# Altium integrated library My_LIB.IntLib: 372 symbols (part 2 of 3) (continued)
## STM32F100CxT6 (continued)
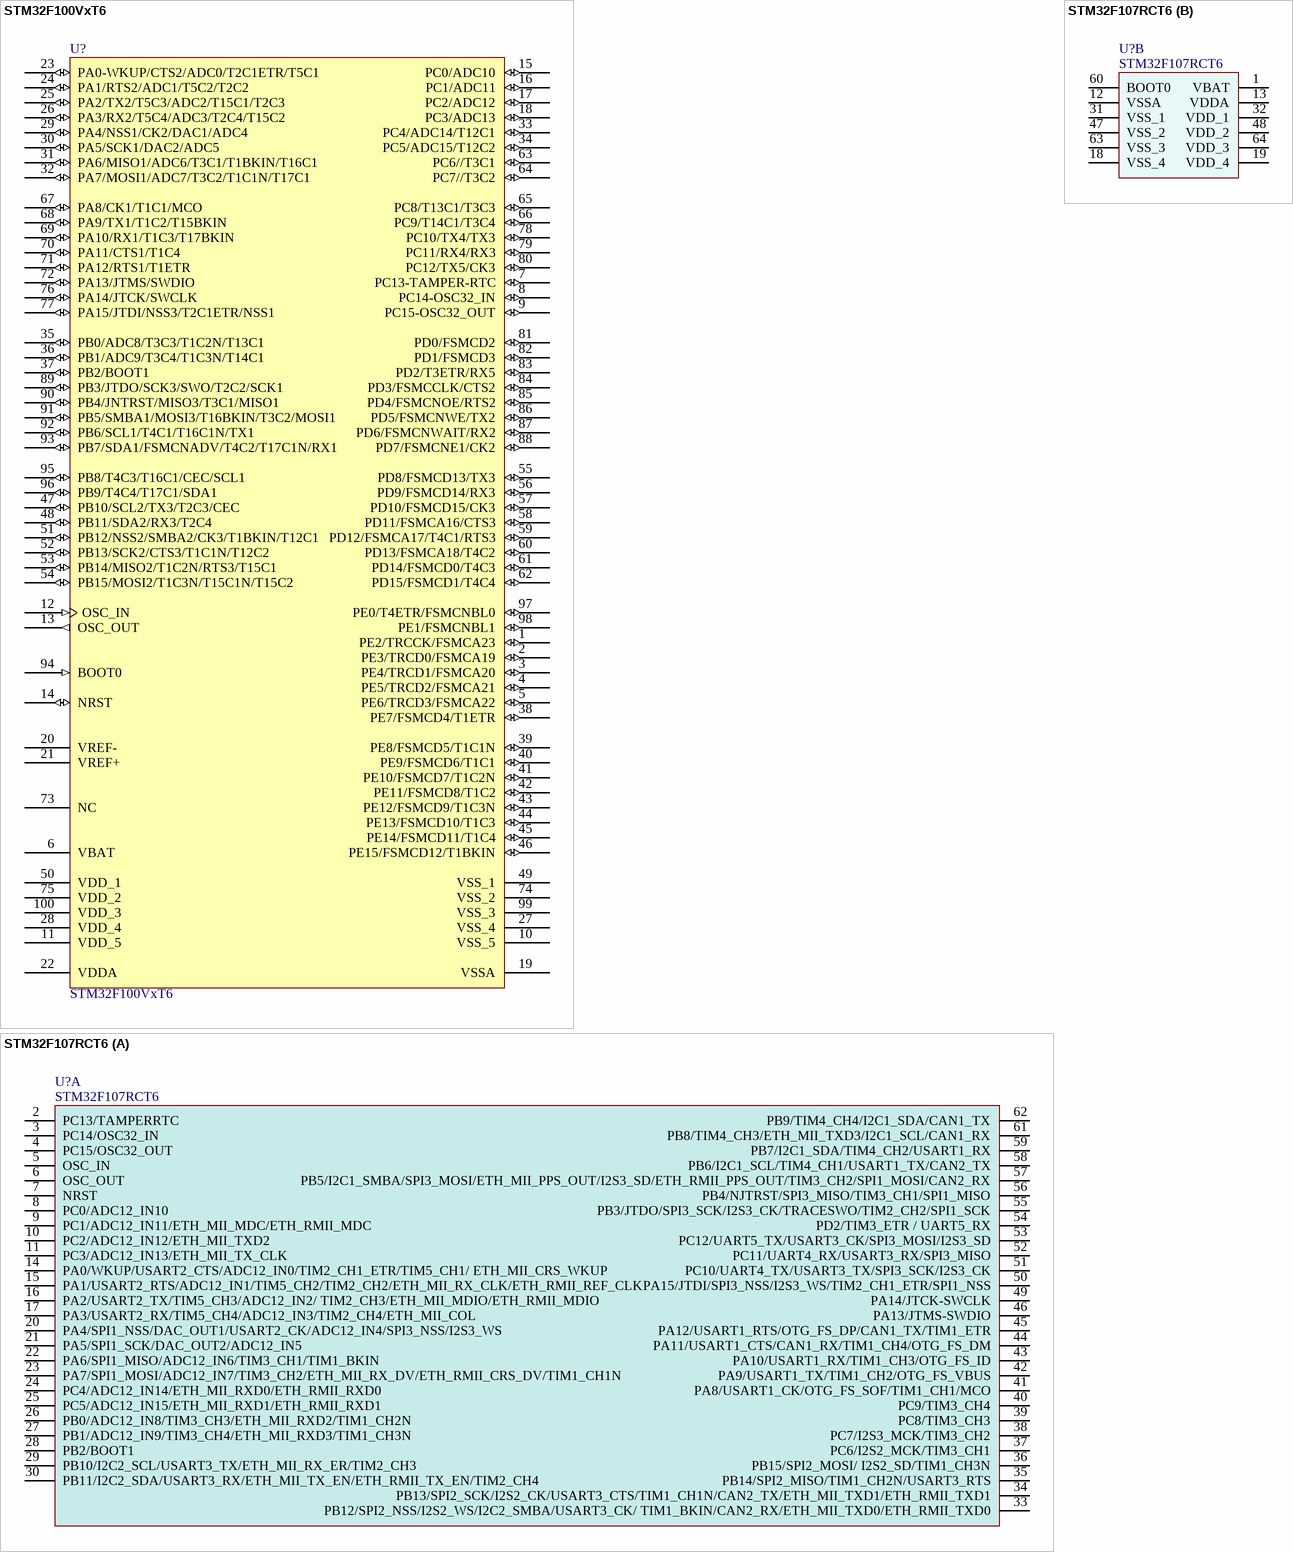
[diagram p11: symbols STM32F100VxT6 to STM32F107RCT6]

## STM32F100VxT6
designator U?
STM32 ARM-based 32-bit MCU with 64 Kbytes Flash, 100-pin LQFP, Industrial Temperature; Published: 30-May-2008; DatasheetVersion: rev6, Mar-2008; PackageVersion: Mar-2008; PackageReference: LQFP100; Publisher: Altium Limited; PackageDescription: 100-Pin Low-Profile Quad Flat Pack, 14 x 14 mm Body, 0.5 mm Pitch (LQFP100); ComponentLink1Description: Manufacturer Link; ComponentLink1URL: www.st.com/stm32; ComponentLink2Description: Datasheet; ComponentLink2URL: http://www.st.com/stonline/products/literature/ds/13587.pdf
footprint LQFP100_N (Thin QFP, 100-Leads, Body 14x14mm, Pitch 0.5mm, IPC Medium Density)
footprint LQFP100_L (Thin QFP, 100-Leads, Body 14x14mm, Pitch 0.5mm, IPC High Density)
footprint LQFP100_M (Thin QFP, 100-Leads, Body 14x14mm, Pitch 0.5mm, IPC Low Density)
pins: 1 PE2/TRCCK/FSMCA23 (io), 2 PE3/TRCD0/FSMCA19 (io), 3 PE4/TRCD1/FSMCA20 (io), 4 PE5/TRCD2/FSMCA21 (io), 5 PE6/TRCD3/FSMCA22 (io), 6 VBAT (power), 7 PC13-TAMPER-RTC (io), 8 PC14-OSC32_IN (io), 9 PC15-OSC32_OUT (io), 10 VSS_5 (power), 11 VDD_5 (power), 12 OSC_IN (in), 13 OSC_OUT (out), 14 NRST (io), 15 PC0/ADC10 (io), 16 PC1/ADC11 (io), 17 PC2/ADC12 (io), 18 PC3/ADC13 (io), 19 VSSA (power), 20 VREF- (power), 21 VREF+ (power), 22 VDDA (power), 23 PA0-WKUP/CTS2/ADC0/T2C1ETR/T5C1 (io), 24 PA1/RTS2/ADC1/T5C2/T2C2 (io), 25 PA2/TX2/T5C3/ADC2/T15C1/T2C3 (io), 26 PA3/RX2/T5C4/ADC3/T2C4/T15C2 (io), 27 VSS_4 (power), 28 VDD_4 (power), 29 PA4/NSS1/CK2/DAC1/ADC4 (io), 30 PA5/SCK1/DAC2/ADC5 (io), 31 PA6/MISO1/ADC6/T3C1/T1BKIN/T16C1 (io), 32 PA7/MOSI1/ADC7/T3C2/T1C1N/T17C1 (io), 33 PC4/ADC14/T12C1 (io), 34 PC5/ADC15/T12C2 (io), 35 PB0/ADC8/T3C3/T1C2N/T13C1 (io), 36 PB1/ADC9/T3C4/T1C3N/T14C1 (io), 37 PB2/BOOT1 (io), 38 PE7/FSMCD4/T1ETR (io), 39 PE8/FSMCD5/T1C1N (io), 40 PE9/FSMCD6/T1C1 (io), 41 PE10/FSMCD7/T1C2N (io), 42 PE11/FSMCD8/T1C2 (io), 43 PE12/FSMCD9/T1C3N (io), 44 PE13/FSMCD10/T1C3 (io), 45 PE14/FSMCD11/T1C4 (io), 46 PE15/FSMCD12/T1BKIN (io), 47 PB10/SCL2/TX3/T2C3/CEC (io), 48 PB11/SDA2/RX3/T2C4 (io), 49 VSS_1 (power), 50 VDD_1 (power), 51 PB12/NSS2/SMBA2/CK3/T1BKIN/T12C1 (io), 52 PB13/SCK2/CTS3/T1C1N/T12C2 (io), 53 PB14/MISO2/T1C2N/RTS3/T15C1 (io), 54 PB15/MOSI2/T1C3N/T15C1N/T15C2 (io), 55 PD8/FSMCD13/TX3 (io), 56 PD9/FSMCD14/RX3 (io), 57 PD10/FSMCD15/CK3 (io), 58 PD11/FSMCA16/CTS3 (io), 59 PD12/FSMCA17/T4C1/RTS3 (io), 60 PD13/FSMCA18/T4C2 (io), 61 PD14/FSMCD0/T4C3 (io), 62 PD15/FSMCD1/T4C4 (io), 63 PC6//T3C1 (io), 64 PC7//T3C2 (io), 65 PC8/T13C1/T3C3 (io), 66 PC9/T14C1/T3C4 (io), 67 PA8/CK1/T1C1/MCO (io), 68 PA9/TX1/T1C2/T15BKIN (io), 69 PA10/RX1/T1C3/T17BKIN (io), 70 PA11/CTS1/T1C4 (io), 71 PA12/RTS1/T1ETR (io), 72 PA13/JTMS/SWDIO (io), 73 NC, 74 VSS_2 (power), 75 VDD_2 (power), 76 PA14/JTCK/SWCLK (io), 77 PA15/JTDI/NSS3/T2C1ETR/NSS1 (io), 78 PC10/TX4/TX3 (io), 79 PC11/RX4/RX3 (io), 80 PC12/TX5/CK3 (io), 81 PD0/FSMCD2 (io), 82 PD1/FSMCD3 (io), 83 PD2/T3ETR/RX5 (io), 84 PD3/FSMCCLK/CTS2 (io), 85 PD4/FSMCNOE/RTS2 (io), 86 PD5/FSMCNWE/TX2 (io), 87 PD6/FSMCNWAIT/RX2 (io), 88 PD7/FSMCNE1/CK2 (io), 89 PB3/JTDO/SCK3/SWO/T2C2/SCK1 (io), 90 PB4/JNTRST/MISO3/T3C1/MISO1 (io), 91 PB5/SMBA1/MOSI3/T16BKIN/T3C2/MOSI1 (io), 92 PB6/SCL1/T4C1/T16C1N/TX1 (io), 93 PB7/SDA1/FSMCNADV/T4C2/T17C1N/RX1 (io), 94 BOOT0 (in), 95 PB8/T4C3/T16C1/CEC/SCL1 (io), 96 PB9/T4C4/T17C1/SDA1 (io), 97 PE0/T4ETR/FSMCNBL0 (io), 98 PE1/FSMCNBL1 (io), 99 VSS_3 (power), 100 VDD_3 (power)

## STM32F107RCT6
designator U?
footprint LQFP64 (Thin QFP, 64-Leads, Body 10x10mm, Pitch 0.5mm, IPC Low Density)
footprint LQFP64-DIL-Slave (Thin QFP, 64-Leads, Body 10x10mm, Pitch 0.5mm, IPC Low Density)
footprint LQFP64-DIL-Main (Thin QFP, 64-Leads, Body 10x10mm, Pitch 0.5mm, IPC Low Density)
part A pins: 2 PC13/TAMPERRTC, 3 PC14/OSC32_IN, 4 PC15/OSC32_OUT, 5 OSC_IN, 6 OSC_OUT, 7 NRST, 8 PC0/ADC12_IN10, 9 PC1/ADC12_IN11/ETH_MII_MDC/ETH_RMII_MDC, 10 PC2/ADC12_IN12/ETH_MII_TXD2, 11 PC3/ADC12_IN13/ETH_MII_TX_CLK, 14 PA0/WKUP/USART2_CTS/ADC12_IN0/TIM2_CH1_ETR/TIM5_CH1/ ETH_MII_CRS_WKUP, 15 PA1/USART2_RTS/ADC12_IN1/TIM5_CH2/TIM2_CH2/ETH_MII_RX_CLK/ETH_RMII_REF_CLK, 16 PA2/USART2_TX/TIM5_CH3/ADC12_IN2/ TIM2_CH3/ETH_MII_MDIO/ETH_RMII_MDIO, 17 PA3/USART2_RX/TIM5_CH4/ADC12_IN3/TIM2_CH4/ETH_MII_COL, 20 PA4/SPI1_NSS/DAC_OUT1/USART2_CK/ADC12_IN4/SPI3_NSS/I2S3_WS, 21 PA5/SPI1_SCK/DAC_OUT2/ADC12_IN5, 22 PA6/SPI1_MISO/ADC12_IN6/TIM3_CH1/TIM1_BKIN, 23 PA7/SPI1_MOSI/ADC12_IN7/TIM3_CH2/ETH_MII_RX_DV/ETH_RMII_CRS_DV/TIM1_CH1N, 24 PC4/ADC12_IN14/ETH_MII_RXD0/ETH_RMII_RXD0, 25 PC5/ADC12_IN15/ETH_MII_RXD1/ETH_RMII_RXD1, 26 PB0/ADC12_IN8/TIM3_CH3/ETH_MII_RXD2/TIM1_CH2N, 27 PB1/ADC12_IN9/TIM3_CH4/ETH_MII_RXD3/TIM1_CH3N, 28 PB2/BOOT1, 29 PB10/I2C2_SCL/USART3_TX/ETH_MII_RX_ER/TIM2_CH3, 30 PB11/I2C2_SDA/USART3_RX/ETH_MII_TX_EN/ETH_RMII_TX_EN/TIM2_CH4, 33 PB12/SPI2_NSS/I2S2_WS/I2C2_SMBA/USART3_CK/ TIM1_BKIN/CAN2_RX/ETH_MII_TXD0/ETH_RMII_TXD0, 34 PB13/SPI2_SCK/I2S2_CK/USART3_CTS/TIM1_CH1N/CAN2_TX/ETH_MII_TXD1/ETH_RMII_TXD1, 35 PB14/SPI2_MISO/TIM1_CH2N/USART3_RTS, 36 PB15/SPI2_MOSI/ I2S2_SD/TIM1_CH3N, 37 PC6/I2S2_MCK/TIM3_CH1, 38 PC7/I2S3_MCK/TIM3_CH2, 39 PC8/TIM3_CH3, 40 PC9/TIM3_CH4, 41 PA8/USART1_CK/OTG_FS_SOF/TIM1_CH1/MCO, 42 PA9/USART1_TX/TIM1_CH2/OTG_FS_VBUS, 43 PA10/USART1_RX/TIM1_CH3/OTG_FS_ID, 44 PA11/USART1_CTS/CAN1_RX/TIM1_CH4/OTG_FS_DM, 45 PA12/USART1_RTS/OTG_FS_DP/CAN1_TX/TIM1_ETR, 46 PA13/JTMS-SWDIO, 49 PA14/JTCK-SWCLK, 50 PA15/JTDI/SPI3_NSS/I2S3_WS/TIM2_CH1_ETR/SPI1_NSS, 51 PC10/UART4_TX/USART3_TX/SPI3_SCK/I2S3_CK, 52 PC11/UART4_RX/USART3_RX/SPI3_MISO, 53 PC12/UART5_TX/USART3_CK/SPI3_MOSI/I2S3_SD, 54 PD2/TIM3_ETR / UART5_RX, 55 PB3/JTDO/SPI3_SCK/I2S3_CK/TRACESWO/TIM2_CH2/SPI1_SCK, 56 PB4/NJTRST/SPI3_MISO/TIM3_CH1/SPI1_MISO, 57 PB5/I2C1_SMBA/SPI3_MOSI/ETH_MII_PPS_OUT/I2S3_SD/ETH_RMII_PPS_OUT/TIM3_CH2/SPI1_MOSI/CAN2_RX, 58 PB6/I2C1_SCL/TIM4_CH1/USART1_TX/CAN2_TX, 59 PB7/I2C1_SDA/TIM4_CH2/USART1_RX, 61 PB8/TIM4_CH3/ETH_MII_TXD3/I2C1_SCL/CAN1_RX, 62 PB9/TIM4_CH4/I2C1_SDA/CAN1_TX
part B pins: 1 VBAT, 12 VSSA, 13 VDDA, 18 VSS_4, 19 VDD_4, 31 VSS_1, 32 VDD_1, 47 VSS_2, 48 VDD_2, 60 BOOT0, 63 VSS_3, 64 VDD_3

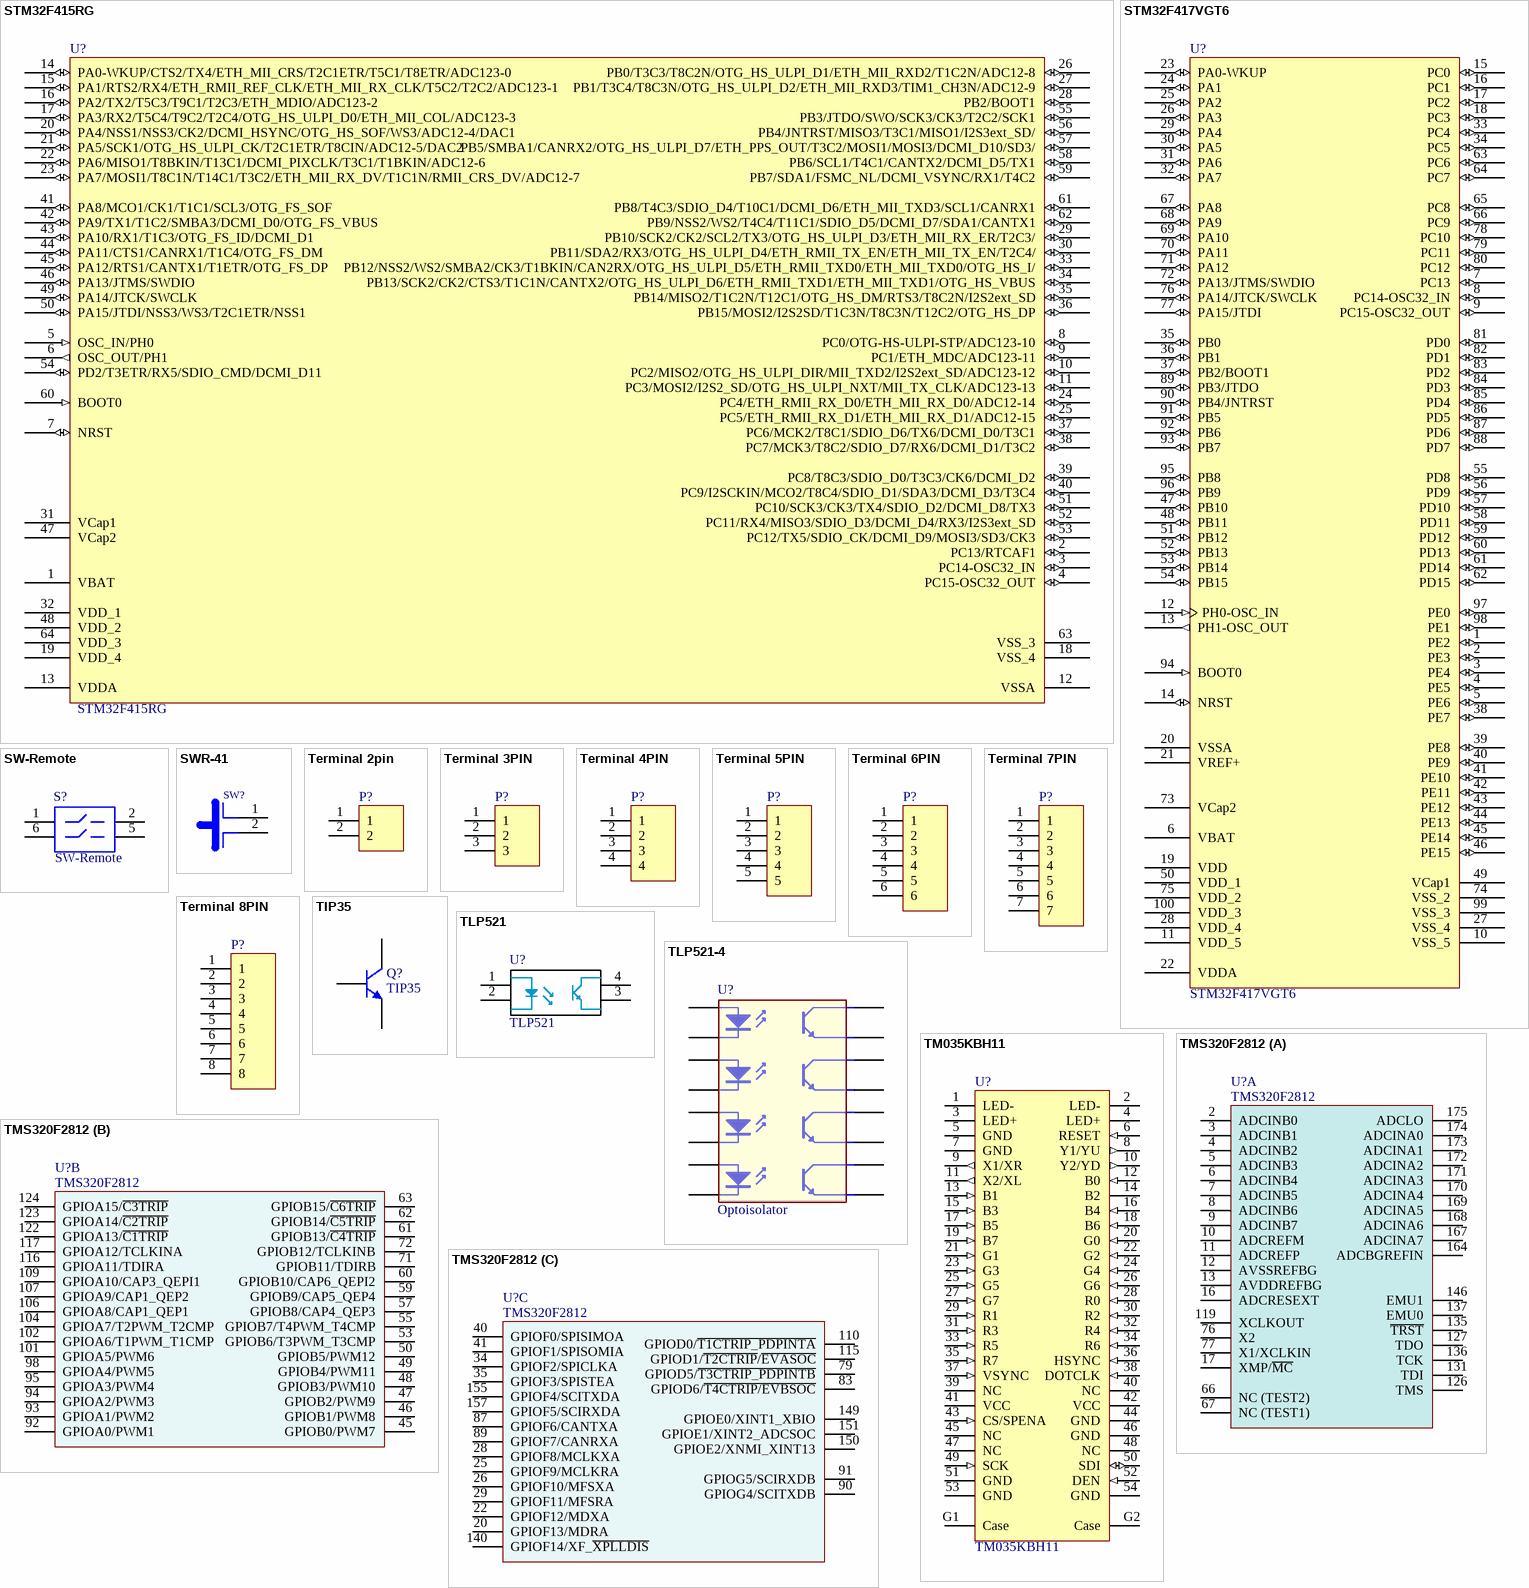
[diagram p12: symbols STM32F415RG to TMS320F2812]

## STM32F415RG
designator U?
Our STM32 Display IC; Published: 30-May-2008; DatasheetVersion: rev6, Mar-2008; PackageVersion: Mar-2008; PackageReference: LQFP64; Publisher: Altium Limited; PackageDescription: 64-Pin Low-Profile Quad Flat Pack, 10 x 10 mm Body, 0.5 mm Pitch (LQFP64); ComponentLink1Description: Manufacturer Link; ComponentLink1URL: www.st.com/stm32; ComponentLink2Description: Datasheet; ComponentLink2URL: http://www.st.com/stonline/products/literature/ds/13586.pdf
footprint LQFP64 (Thin QFP, 64-Leads, Body 10x10mm, Pitch 0.5mm, IPC Low Density)
pins: 1 VBAT (power), 2 PC13/RTCAF1 (io), 3 PC14-OSC32_IN (io), 4 PC15-OSC32_OUT (io), 5 OSC_IN/PH0 (in), 6 OSC_OUT/PH1 (out), 7 NRST (io), 8 PC0/OTG-HS-ULPI-STP/ADC123-10 (io), 9 PC1/ETH_MDC/ADC123-11 (io), 10 PC2/MISO2/OTG_HS_ULPI_DIR/MII_TXD2/I2S2ext_SD/ADC123-12 (io), 11 PC3/MOSI2/I2S2_SD/OTG_HS_ULPI_NXT/MII_TX_CLK/ADC123-13 (io), 12 VSSA (power), 13 VDDA (power), 14 PA0-WKUP/CTS2/TX4/ETH_MII_CRS/T2C1ETR/T5C1/T8ETR/ADC123-0 (io), 15 PA1/RTS2/RX4/ETH_RMII_REF_CLK/ETH_MII_RX_CLK/T5C2/T2C2/ADC123-1 (io), 16 PA2/TX2/T5C3/T9C1/T2C3/ETH_MDIO/ADC123-2 (io), 17 PA3/RX2/T5C4/T9C2/T2C4/OTG_HS_ULPI_D0/ETH_MII_COL/ADC123-3 (io), 18 VSS_4 (power), 19 VDD_4 (power), 20 PA4/NSS1/NSS3/CK2/DCMI_HSYNC/OTG_HS_SOF/WS3/ADC12-4/DAC1 (io), 21 PA5/SCK1/OTG_HS_ULPI_CK/T2C1ETR/T8CIN/ADC12-5/DAC2 (io), 22 PA6/MISO1/T8BKIN/T13C1/DCMI_PIXCLK/T3C1/T1BKIN/ADC12-6 (io), 23 PA7/MOSI1/T8C1N/T14C1/T3C2/ETH_MII_RX_DV/T1C1N/RMII_CRS_DV/ADC12-7 (io), 24 PC4/ETH_RMII_RX_D0/ETH_MII_RX_D0/ADC12-14 (io), 25 PC5/ETH_RMII_RX_D1/ETH_MII_RX_D1/ADC12-15 (io), 26 PB0/T3C3/T8C2N/OTG_HS_ULPI_D1/ETH_MII_RXD2/T1C2N/ADC12-8 (io), 27 PB1/T3C4/T8C3N/OTG_HS_ULPI_D2/ETH_MII_RXD3/TIM1_CH3N/ADC12-9 (io), 28 PB2/BOOT1 (io), 29 PB10/SCK2/CK2/SCL2/TX3/OTG_HS_ULPI_D3/ETH_MII_RX_ER/T2C3/ (io), 30 PB11/SDA2/RX3/OTG_HS_ULPI_D4/ETH_RMII_TX_EN/ETH_MII_TX_EN/T2C4/ (io), 31 VCap1 (power), 32 VDD_1 (power), 33 PB12/NSS2/WS2/SMBA2/CK3/T1BKIN/CAN2RX/OTG_HS_ULPI_D5/ETH_RMII_TXD0/ETH_MII_TXD0/OTG_HS_I/ (io), 34 PB13/SCK2/CK2/CTS3/T1C1N/CANTX2/OTG_HS_ULPI_D6/ETH_RMII_TXD1/ETH_MII_TXD1/OTG_HS_VBUS (io), 35 PB14/MISO2/T1C2N/T12C1/OTG_HS_DM/RTS3/T8C2N/I2S2ext_SD (io), 36 PB15/MOSI2/I2S2SD/T1C3N/T8C3N/T12C2/OTG_HS_DP (io), 37 PC6/MCK2/T8C1/SDIO_D6/TX6/DCMI_D0/T3C1 (io), 38 PC7/MCK3/T8C2/SDIO_D7/RX6/DCMI_D1/T3C2 (io), 39 PC8/T8C3/SDIO_D0/T3C3/CK6/DCMI_D2 (io), 40 PC9/I2SCKIN/MCO2/T8C4/SDIO_D1/SDA3/DCMI_D3/T3C4 (io), 41 PA8/MCO1/CK1/T1C1/SCL3/OTG_FS_SOF (io), 42 PA9/TX1/T1C2/SMBA3/DCMI_D0/OTG_FS_VBUS (io), 43 PA10/RX1/T1C3/OTG_FS_ID/DCMI_D1 (io), 44 PA11/CTS1/CANRX1/T1C4/OTG_FS_DM (io), 45 PA12/RTS1/CANTX1/T1ETR/OTG_FS_DP (io), 46 PA13/JTMS/SWDIO (io), 47 VCap2 (power), 48 VDD_2 (power), 49 PA14/JTCK/SWCLK (io), 50 PA15/JTDI/NSS3/WS3/T2C1ETR/NSS1 (io), 51 PC10/SCK3/CK3/TX4/SDIO_D2/DCMI_D8/TX3 (io), 52 PC11/RX4/MISO3/SDIO_D3/DCMI_D4/RX3/I2S3ext_SD (io), 53 PC12/TX5/SDIO_CK/DCMI_D9/MOSI3/SD3/CK3 (io), 54 PD2/T3ETR/RX5/SDIO_CMD/DCMI_D11 (io), 55 PB3/JTDO/SWO/SCK3/CK3/T2C2/SCK1 (io), 56 PB4/JNTRST/MISO3/T3C1/MISO1/I2S3ext_SD/ (io), 57 PB5/SMBA1/CANRX2/OTG_HS_ULPI_D7/ETH_PPS_OUT/T3C2/MOSI1/MOSI3/DCMI_D10/SD3/ (io), 58 PB6/SCL1/T4C1/CANTX2/DCMI_D5/TX1 (io), 59 PB7/SDA1/FSMC_NL/DCMI_VSYNC/RX1/T4C2 (io), 60 BOOT0 (in), 61 PB8/T4C3/SDIO_D4/T10C1/DCMI_D6/ETH_MII_TXD3/SCL1/CANRX1 (io), 62 PB9/NSS2/WS2/T4C4/T11C1/SDIO_D5/DCMI_D7/SDA1/CANTX1 (io), 63 VSS_3 (power), 64 VDD_3 (power)

## STM32F417VGT6
designator U?
STM32 ARM-based 32-bit MCU with 64 Kbytes Flash, 100-pin LQFP, Industrial Temperature; Published: 30-May-2008; DatasheetVersion: rev6, Mar-2008; PackageVersion: Mar-2008; PackageReference: LQFP100; Publisher: Altium Limited; PackageDescription: 100-Pin Low-Profile Quad Flat Pack, 14 x 14 mm Body, 0.5 mm Pitch (LQFP100); ComponentLink1Description: Manufacturer Link; ComponentLink1URL: www.st.com/stm32; ComponentLink2Description: Datasheet; ComponentLink2URL: http://www.st.com/stonline/products/literature/ds/13587.pdf
footprint LQFP100_N (Thin QFP, 100-Leads, Body 14x14mm, Pitch 0.5mm, IPC Medium Density)
footprint LQFP100_L (Thin QFP, 100-Leads, Body 14x14mm, Pitch 0.5mm, IPC High Density)
footprint LQFP100_M (Thin QFP, 100-Leads, Body 14x14mm, Pitch 0.5mm, IPC Low Density)
pins: 1 PE2 (io), 2 PE3 (io), 3 PE4 (io), 4 PE5 (io), 5 PE6 (io), 6 VBAT (power), 7 PC13 (io), 8 PC14-OSC32_IN (io), 9 PC15-OSC32_OUT (io), 10 VSS_5 (power), 11 VDD_5 (power), 12 PH0-OSC_IN (in), 13 PH1-OSC_OUT (out), 14 NRST (io), 15 PC0 (io), 16 PC1 (io), 17 PC2 (io), 18 PC3 (io), 19 VDD (power), 20 VSSA (power), 21 VREF+ (power), 22 VDDA (power), 23 PA0-WKUP (io), 24 PA1 (io), 25 PA2 (io), 26 PA3 (io), 27 VSS_4 (power), 28 VDD_4 (power), 29 PA4 (io), 30 PA5 (io), 31 PA6 (io), 32 PA7 (io), 33 PC4 (io), 34 PC5 (io), 35 PB0 (io), 36 PB1 (io), 37 PB2/BOOT1 (io), 38 PE7 (io), 39 PE8 (io), 40 PE9 (io), 41 PE10 (io), 42 PE11 (io), 43 PE12 (io), 44 PE13 (io), 45 PE14 (io), 46 PE15 (io), 47 PB10 (io), 48 PB11 (io), 49 VCap1, 50 VDD_1 (power), 51 PB12 (io), 52 PB13 (io), 53 PB14 (io), 54 PB15 (io), 55 PD8 (io), 56 PD9 (io), 57 PD10 (io), 58 PD11 (io), 59 PD12 (io), 60 PD13 (io), 61 PD14 (io), 62 PD15 (io), 63 PC6 (io), 64 PC7 (io), 65 PC8 (io), 66 PC9 (io), 67 PA8 (io), 68 PA9 (io), 69 PA10 (io), 70 PA11 (io), 71 PA12 (io), 72 PA13/JTMS/SWDIO (io), 73 VCap2, 74 VSS_2 (power), 75 VDD_2 (power), 76 PA14/JTCK/SWCLK (io), 77 PA15/JTDI (io), 78 PC10 (io), 79 PC11 (io), 80 PC12 (io), 81 PD0 (io), 82 PD1 (io), 83 PD2 (io), 84 PD3 (io), 85 PD4 (io), 86 PD5 (io), 87 PD6 (io), 88 PD7 (io), 89 PB3/JTDO (io), 90 PB4/JNTRST (io), 91 PB5 (io), 92 PB6 (io), 93 PB7 (io), 94 BOOT0 (in), 95 PB8 (io), 96 PB9 (io), 97 PE0 (io), 98 PE1 (io), 99 VSS_3 (power), 100 VDD_3 (power)

## SW-Remote
designator S?
DIP Switch; Published: 24-Mar-1999; LatestRevisionDate: 17-Jul-2002; LatestRevisionNote: Re-released for DXP Platform.; PackageReference: DIP-8; Publisher: Altium Limited
footprint Remote Switch
pins: 1, 2, 5, 6

## SWR-41
designator SW?
Button
footprint Sw_Tact 4pin-big
footprint Sw_Tact 4pin
footprint Sw_Tact 2pin
pins: 1, 2

## Terminal 2pin
designator P?
footprint Terminal 2pin
pins: 1, 2

## Terminal 3PIN
designator P?
PartNumber: LM386N-1; Manufacturer: National Semiconductor; CompType: Audio IC; PackageTopMarking: NSUZXYTT*LM*386N-1; Published: 27-Nov-2008; DatasheetVersion: Aug-2000; PackageVersion: revG, May-2006; PackageReference: N08E; PackageDescription: MDIP, .365 x .250 x .130in, 8 Lead, .100in Pitch; RoHS: O; PinCount: 8; DigiKeyPartNumber: LM386N-1-ND; Code_JEDEC: MS-001-BA; ComponentLink1Description: LM386 Datasheet; ComponentLink1URL: http://www.national.com/ds/LM/LM386.pdf; ComponentLink2Description: LM386 Web Page; ComponentLink2URL: http://www.national.com/pf/LM/LM386.html; ComponentLink3Description: N08E Package Page; ComponentLink3URL: http://www.national.com/packaging/folders/n08e.html
footprint Terminal 3Pin
pins: 1 (power), 2, 3

## Terminal 4PIN
designator P?
PartNumber: LM386N-1; Manufacturer: National Semiconductor; CompType: Audio IC; PackageTopMarking: NSUZXYTT*LM*386N-1; Published: 27-Nov-2008; DatasheetVersion: Aug-2000; PackageVersion: revG, May-2006; PackageReference: N08E; PackageDescription: MDIP, .365 x .250 x .130in, 8 Lead, .100in Pitch; RoHS: O; PinCount: 8; DigiKeyPartNumber: LM386N-1-ND; Code_JEDEC: MS-001-BA; ComponentLink1Description: LM386 Datasheet; ComponentLink1URL: http://www.national.com/ds/LM/LM386.pdf; ComponentLink2Description: LM386 Web Page; ComponentLink2URL: http://www.national.com/pf/LM/LM386.html; ComponentLink3Description: N08E Package Page; ComponentLink3URL: http://www.national.com/packaging/folders/n08e.html
footprint Terminal 4Pin
pins: 1 (power), 2, 3, 4

## Terminal 5PIN
designator P?
PartNumber: LM386N-1; Manufacturer: National Semiconductor; CompType: Audio IC; PackageTopMarking: NSUZXYTT*LM*386N-1; Published: 27-Nov-2008; DatasheetVersion: Aug-2000; PackageVersion: revG, May-2006; PackageReference: N08E; PackageDescription: MDIP, .365 x .250 x .130in, 8 Lead, .100in Pitch; RoHS: O; PinCount: 8; DigiKeyPartNumber: LM386N-1-ND; Code_JEDEC: MS-001-BA; ComponentLink1Description: LM386 Datasheet; ComponentLink1URL: http://www.national.com/ds/LM/LM386.pdf; ComponentLink2Description: LM386 Web Page; ComponentLink2URL: http://www.national.com/pf/LM/LM386.html; ComponentLink3Description: N08E Package Page; ComponentLink3URL: http://www.national.com/packaging/folders/n08e.html
footprint Terminal 5Pin
pins: 1 (power), 2, 3, 4, 5

## Terminal 6PIN
designator P?
PartNumber: LM386N-1; Manufacturer: National Semiconductor; CompType: Audio IC; PackageTopMarking: NSUZXYTT*LM*386N-1; Published: 27-Nov-2008; DatasheetVersion: Aug-2000; PackageVersion: revG, May-2006; PackageReference: N08E; PackageDescription: MDIP, .365 x .250 x .130in, 8 Lead, .100in Pitch; RoHS: O; PinCount: 8; DigiKeyPartNumber: LM386N-1-ND; Code_JEDEC: MS-001-BA; ComponentLink1Description: LM386 Datasheet; ComponentLink1URL: http://www.national.com/ds/LM/LM386.pdf; ComponentLink2Description: LM386 Web Page; ComponentLink2URL: http://www.national.com/pf/LM/LM386.html; ComponentLink3Description: N08E Package Page; ComponentLink3URL: http://www.national.com/packaging/folders/n08e.html
footprint Terminal 6Pin
pins: 1 (power), 2, 3, 4, 5, 6

## Terminal 7PIN
designator P?
PartNumber: LM386N-1; Manufacturer: National Semiconductor; CompType: Audio IC; PackageTopMarking: NSUZXYTT*LM*386N-1; Published: 27-Nov-2008; DatasheetVersion: Aug-2000; PackageVersion: revG, May-2006; PackageReference: N08E; PackageDescription: MDIP, .365 x .250 x .130in, 8 Lead, .100in Pitch; RoHS: O; PinCount: 8; DigiKeyPartNumber: LM386N-1-ND; Code_JEDEC: MS-001-BA; ComponentLink1Description: LM386 Datasheet; ComponentLink1URL: http://www.national.com/ds/LM/LM386.pdf; ComponentLink2Description: LM386 Web Page; ComponentLink2URL: http://www.national.com/pf/LM/LM386.html; ComponentLink3Description: N08E Package Page; ComponentLink3URL: http://www.national.com/packaging/folders/n08e.html
footprint Terminal 7Pin
pins: 1 (power), 2, 3, 4, 5, 6, 7

## Terminal 8PIN
designator P?
PartNumber: LM386N-1; Manufacturer: National Semiconductor; CompType: Audio IC; PackageTopMarking: NSUZXYTT*LM*386N-1; Published: 27-Nov-2008; DatasheetVersion: Aug-2000; PackageVersion: revG, May-2006; PackageReference: N08E; PackageDescription: MDIP, .365 x .250 x .130in, 8 Lead, .100in Pitch; RoHS: O; PinCount: 8; DigiKeyPartNumber: LM386N-1-ND; Code_JEDEC: MS-001-BA; ComponentLink1Description: LM386 Datasheet; ComponentLink1URL: http://www.national.com/ds/LM/LM386.pdf; ComponentLink2Description: LM386 Web Page; ComponentLink2URL: http://www.national.com/pf/LM/LM386.html; ComponentLink3Description: N08E Package Page; ComponentLink3URL: http://www.national.com/packaging/folders/n08e.html
footprint Terminal 8Pin
pins: 1 (power), 2, 3, 4, 5, 6, 7, 8

## TIP35
designator Q?
power npn transistor
footprint TOP3 (To-218)
pins: 1 B, 2 C, 3 E

## TLP521
designator U?
footprint DIP-4
pins: 1, 2, 3, 4

## TLP521-4
designator U?, comment Optoisolator
4 Optoisolator's
footprint DIP-16
pins: 1 A, 2 K, 3 A, 4 K, 5 A, 6 K, 7 A, 8 K, 9 E, 10 C, 11 E, 12 C, 13 E, 14 C, 15 E, 16 C

## TM035KBH11
designator U?
Display 320x240 3.5"
footprint AVX046240054005800 (0.5mm pitch 54 way connector fot TM035KBH11 TFT display)
pins: 1 LED-, 2 LED-, 3 LED+, 4 LED+, 5 GND, 6 RESET (in), 7 GND, 8 Y1/YU (out), 9 X1/XR (out), 10 Y2/YD (out), 11 X2/XL (out), 12 B0 (in), 13 B1 (in), 14 B2, 15 B3 (in), 16 B4 (in), 17 B5 (in), 18 B6 (in), 19 B7 (in), 20 G0 (in), 21 G1 (in), 22 G2 (in), 23 G3 (in), 24 G4 (in), 25 G5 (in), 26 G6 (in), 27 G7 (in), 28 R0 (in), 29 R1 (in), 30 R2 (in), 31 R3 (in), 32 R4 (in), 33 R5 (in), 34 R6 (in), 35 R7 (in), 36 HSYNC (in), 37 VSYNC (in), 38 DOTCLK (in), 39 NC, 40 NC, 41 VCC, 42 VCC, 43 CS/SPENA (in) "Serial Port Data Enable Signal", 44 GND, 45 NC, 46 GND, 47 NC, 48 NC, 49 SCK (in) "SPI serial clock", 50 SDI (io) "SPI serial clock", 51 GND, 52 DEN (in) "Data enable signal", 53 GND "SPI serial data io", 54 GND "SPI serial data io", G1 Case "SPI serial data io", G2 Case "SPI serial data io"

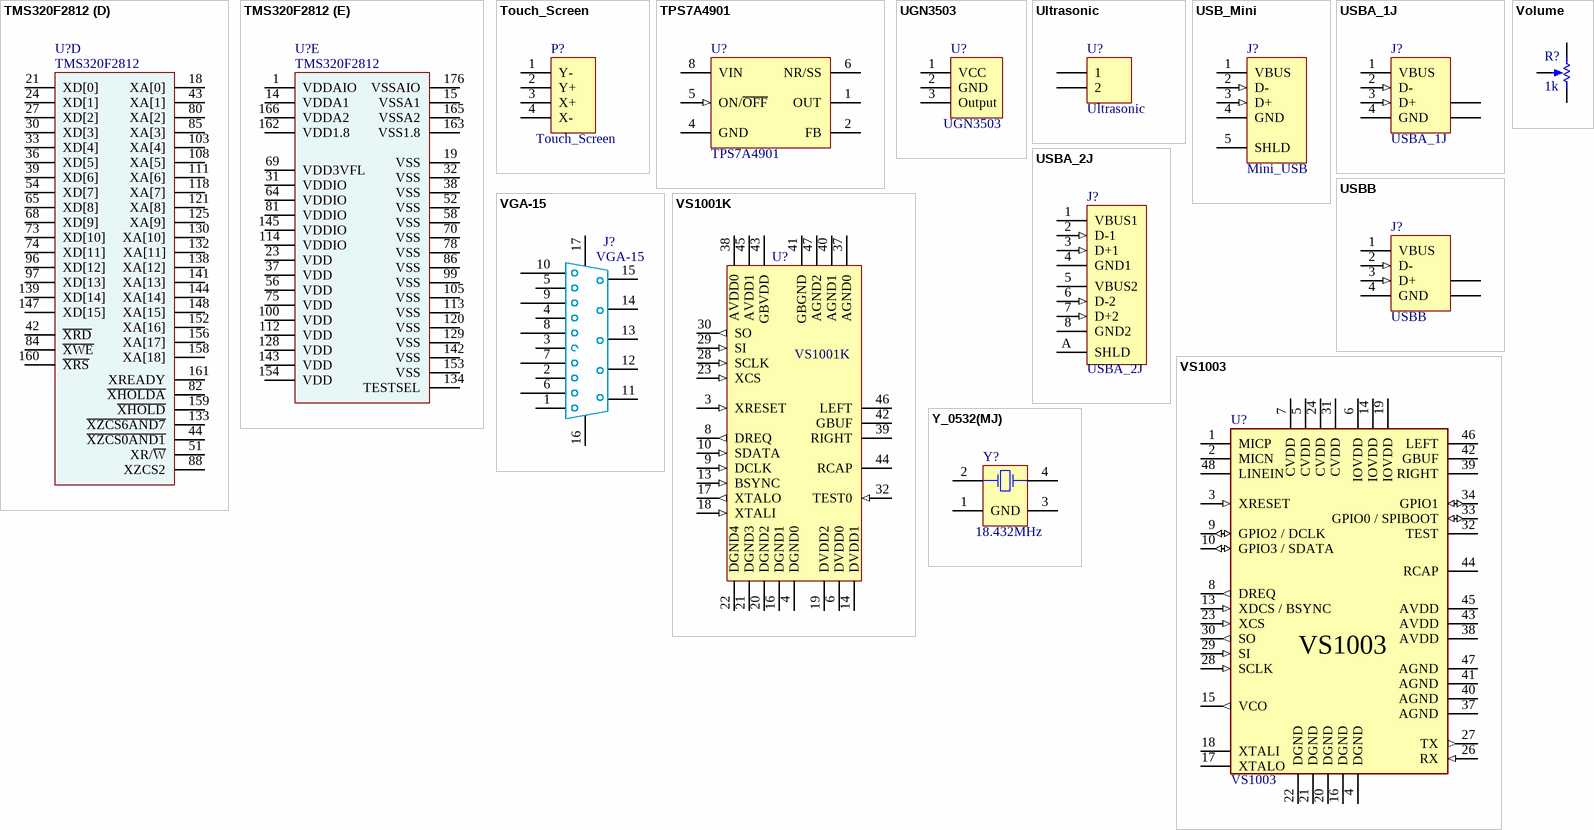
[diagram p13: symbols TMS320F2812 to Y_0532(MJ)]